# Altium footprint library THU.PcbLib: 477 footprints (part 18 of 30)
Each footprint in its own frame and in the unit in brackets; x right, y up, seen from the top. Pads: shape width x height; smd on the part's side, far side on the other; paste and mask are expansions set on the pad; w line width, h text height; cw(c..) or ccw(c..) is an arc to the next point about the centre after c.
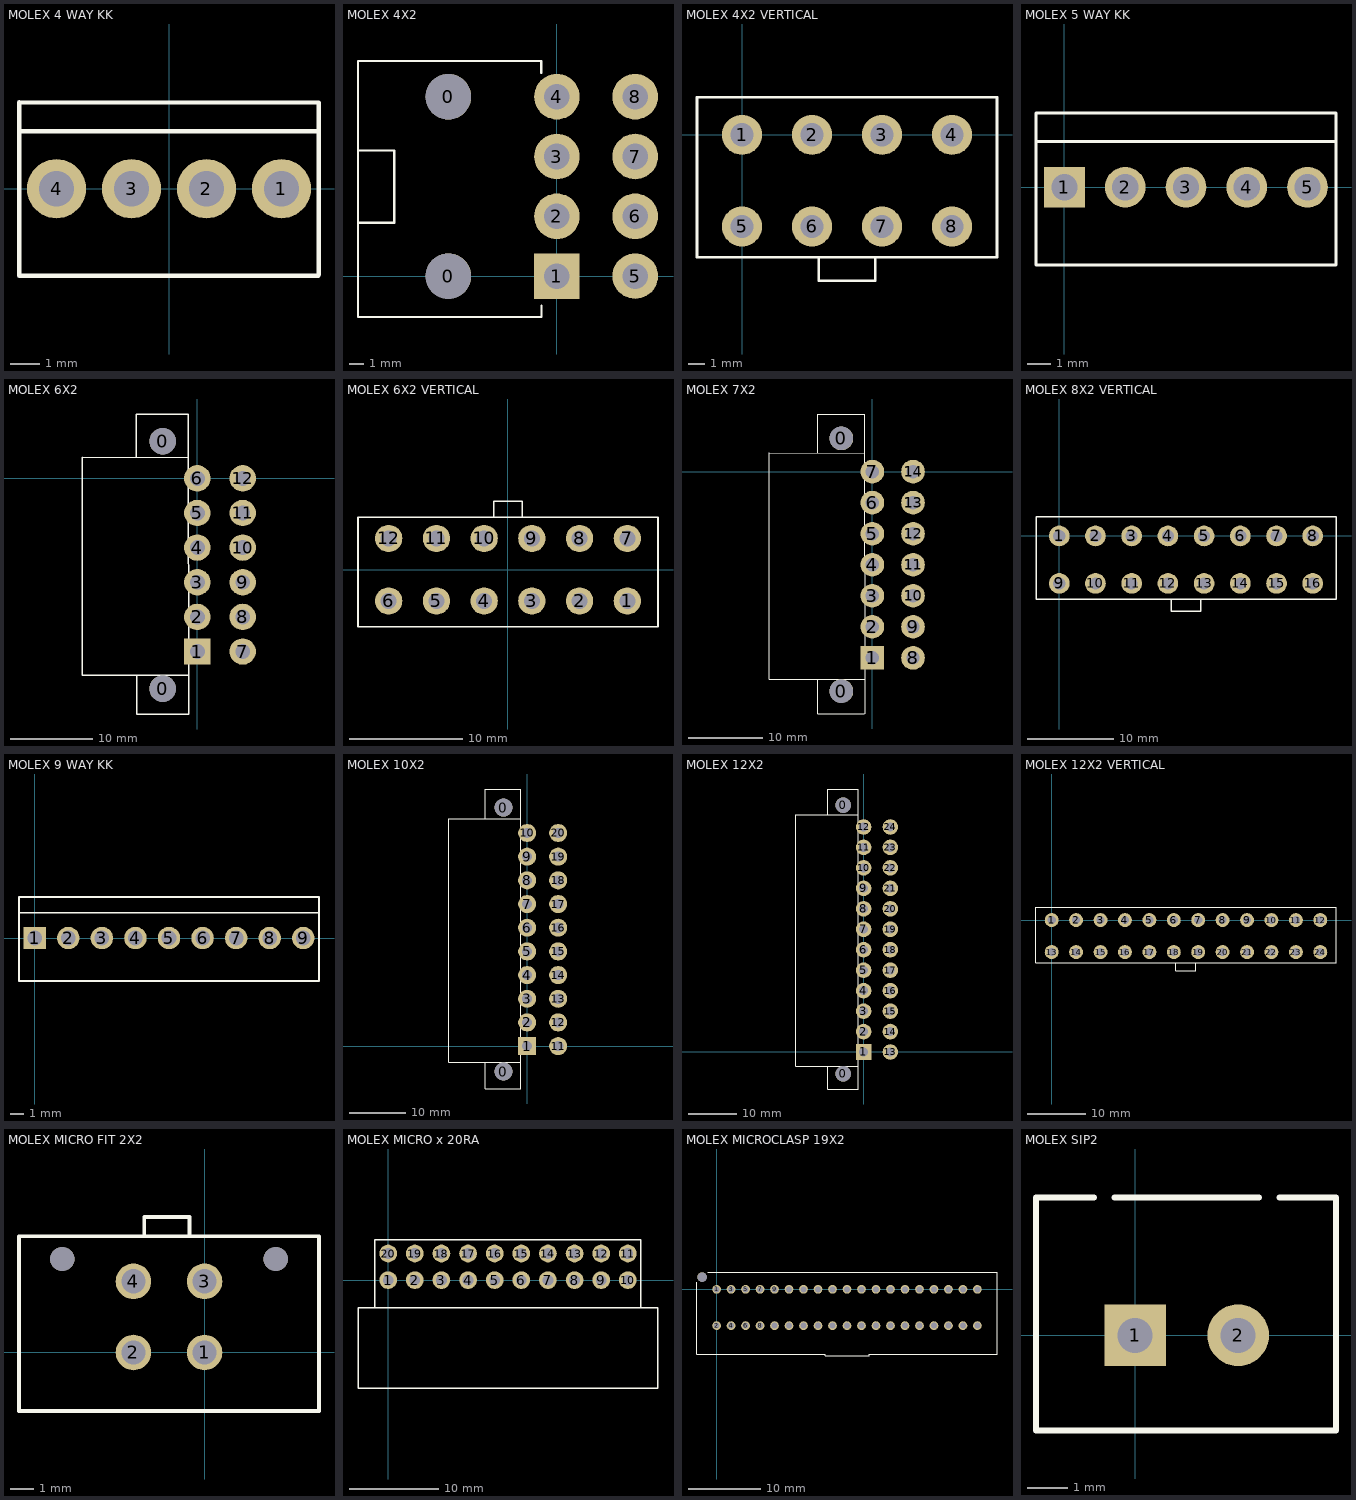
[diagram p17: the footprints below, top view; thin cyan lines are the x and y axes]

## MOLEX 4 WAY KK [mm] "VERTICAL MOUNT"
pads (4):
  round 2 hole 1.19: 1(3.81,0) 2(1.27,0) 3(-1.27,0) 4(-3.81,0)
TopOverlay:
  lines w0.152: -5.08,1.94 5.08,1.94 ; 5.06,-2.94 -5.08,-2.94 -5.08,2.921 5.08,2.92 5.08,-2.92
3D body "022292041.stp": height 11.74, standoff -3.52, extent -5.08,-2.9 5.08,2.9

## MOLEX 4X2 [mm]
pads (10):
  round 3.2 hole 3.2: 0(-7.62,0) 0(-7.62,12.6)
  rect 3.2x3.2 hole 1.8: 1(0,0)
  round 3.2 hole 1.8: 2(0,4.2) 3(0,8.4) 4(0,12.6) 5(5.5,0) 6(5.5,4.2) 7(5.5,8.4) 8(5.5,12.6)
TopOverlay:
  lines w0.152: -13.97,3.743 -11.43,3.743 -11.43,8.823 -13.97,8.823 ; -1.1,14.285 -1.1,15.1 -13.97,15.106 -13.97,-2.87 -1.092,-2.87 -1.092,-2.083

## MOLEX 4X2 VERTICAL [mm] "P/N 39-28-1043"
height 12.8
pads (8):
  round 2.4 hole 1.4: 1(0,0) 2(4.2,0) 3(8.4,0) 4(12.6,0) 5(0,-5.5) 6(4.2,-5.5) 7(8.4,-5.5) 8(12.6,-5.5)
TopOverlay:
  lines w0.152: 4.6,-7.35 4.6,-8.75 6.3,-8.75 8,-8.75 8,-7.35 ; -2.7,-7.35 15.3,-7.35 15.3,2.25 -2.7,2.25 -2.7,-7.35

## MOLEX 5 WAY KK [mm]
pads (5):
  rect 1.7x1.7 hole 1.1: 1(0,0)
  round 1.7 hole 1.1: 2(2.54,0) 3(5.08,0) 4(7.62,0) 5(10.16,0)
TopOverlay:
  lines w0.127: -1.19,1.905 11.35,1.905 ; -1.19,-3.25 11.35,-3.25 11.35,3.1 -1.19,3.1 -1.19,-3.25
3D body: height 8.18, standoff 0, extent -1.19,2.514 11.347,3.074
3D body: height 3.18, standoff 0, extent -1.19,-3.25 11.35,3.1
3D body: height 8.18, standoff 7.18, extent -1.19,1.957 11.35,3.1
3D body: height 10.67, standoff 3.18, extent 2.119,-0.381 2.881,0.381
3D body: height 10.67, standoff 3.18, extent -0.381,-0.381 0.381,0.381
3D body: height 10.67, standoff 3.18, extent 4.659,-0.381 5.421,0.381
3D body: height 10.67, standoff 3.18, extent 7.199,-0.381 7.961,0.381
3D body: height 10.67, standoff 3.18, extent 9.739,-0.381 10.501,0.381

## MOLEX 6X2 [mm]
pads (14):
  round 3.2 hole 3.2: 0(-4.2,-25.5) 0(-4.2,4.5)
  rect 3.2x3.2 hole 1.8: 1(0,-21)
  round 3.2 hole 1.8: 2(0,-16.8) 3(0,-12.6) 4(0,-8.4) 5(0,-4.2) 6(0,0) 7(5.5,-21) 8(5.5,-16.8) 9(5.5,-12.6) 10(5.5,-8.4) 11(5.5,-4.2) 12(5.5,0)
TopOverlay:
  lines w0.152: -7.4,2.5 -7.4,7.8 -1.1,7.8 -1.016,-28.575 -7.366,-28.575 -7.366,-23.876 ; -1.1,-23.9 -13.97,-23.876 -13.97,2.54 -1.1,2.5

## MOLEX 6X2 VERTICAL [mm] "39-28-1063"
pads (12):
  round 2.4 hole 1.4: 1(10.5,-2.75) 2(6.3,-2.75) 3(2.1,-2.75) 4(-2.1,-2.75) 5(-6.3,-2.75) 6(-10.5,-2.75) 7(10.5,2.75) 8(6.3,2.75) 9(2.1,2.75) 10(-2.1,2.75) 11(-6.3,2.75) 12(-10.5,2.75)
TopOverlay:
  lines w0.127: -13.2,-5 13.2,-5 ; -13.2,4.6 13.2,4.6 ; -1.27,4.6 -1.27,6 1.27,6 1.27,4.6
  lines w0.152: -13.2,-5 -13.2,4.6 ; 13.2,-5 13.2,4.6
3D body "039281123.stp": height 12.8, standoff -3.5, extent -13.6,-4.904 13.6,6.096

## MOLEX 7X2 [mm]
pads (16):
  round 3.2 hole 3.2: 0(-4.2,-29.7) 0(-4.2,4.5)
  rect 3.2x3.2 hole 1.8: 1(0,-25.2)
  round 3.2 hole 1.8: 2(0,-21) 3(0,-16.8) 4(0,-12.6) 5(0,-8.4) 6(0,-4.2) 7(0,0) 8(5.5,-25.2) 9(5.5,-21) 10(5.5,-16.8) 11(5.5,-12.6) 12(5.5,-8.4) 13(5.5,-4.2) 14(5.5,0)
TopOverlay:
  lines w0.152: -7.4,-28.1 -7.4,-32.8 -1.1,-32.8 ; -7.4,2.5 -7.4,7.8 -1.1,7.8 -1.016,-32.766 ; -1.1,-28.1 -13.97,-28.067 -13.97,2.54 -1.1,2.5

## MOLEX 8X2 VERTICAL [mm] "P/N 39-28-1163"
height 12.8
pads (16):
  round 2.4 hole 1.4: 1(0,0) 2(4.2,0) 3(8.4,0) 4(12.6,0) 5(16.8,0) 6(21,0) 7(25.2,0) 8(29.4,0) 9(0,-5.5) 10(4.2,-5.5) 11(8.4,-5.5) 12(12.6,-5.5) 13(16.8,-5.5) 14(21,-5.5) 15(25.2,-5.5) 16(29.4,-5.5)
TopOverlay:
  lines w0.152: 13,-7.35 13,-8.75 14.7,-8.75 16.4,-8.75 16.4,-7.35 ; -2.7,-7.35 -2.7,2.25 32.1,2.25 32.1,-7.35 -2.7,-7.35

## MOLEX 9 WAY KK [mm]
pads (9):
  rect 1.7x1.7 hole 1.1: 1(0,0)
  round 1.7 hole 1.1: 2(2.54,0) 3(5.08,0) 4(7.62,0) 5(10.16,0) 6(12.7,0) 7(15.24,0) 8(17.78,0) 9(20.32,0)
TopOverlay:
  lines w0.127: -1.19,1.905 21.51,1.905 ; 21.463,-3.25 -1.19,-3.25 -1.19,3.1 21.19,3.1 21.51,3.1 21.51,-3.25
3D body: height 10.67, standoff 3.18, extent 19.899,-0.381 20.661,0.381
3D body: height 10.67, standoff 3.18, extent 17.359,-0.381 18.121,0.381
3D body: height 10.67, standoff 3.18, extent 14.819,-0.381 15.581,0.381
3D body: height 10.67, standoff 3.18, extent 12.279,-0.381 13.041,0.381
3D body: height 10.67, standoff 3.18, extent 9.739,-0.381 10.501,0.381
3D body: height 10.67, standoff 3.18, extent 7.199,-0.381 7.961,0.381
3D body: height 10.67, standoff 3.18, extent 4.659,-0.381 5.421,0.381
3D body: height 10.67, standoff 3.18, extent -0.381,-0.381 0.381,0.381
3D body: height 10.67, standoff 3.18, extent 2.119,-0.381 2.881,0.381
3D body: height 8.18, standoff 7.18, extent -1.19,1.957 21.51,3.1
3D body: height 3.18, standoff 0, extent -1.19,-3.25 21.51,3.1
3D body: height 8.18, standoff 0, extent -1.19,2.54 21.503,3.1

## MOLEX 10X2 [mm]
pads (22):
  round 3.2 hole 3.2: 0(-4.2,-4.5) 0(-4.2,42.3)
  rect 3.2x3.2 hole 1.8: 1(0,0)
  round 3.2 hole 1.8: 2(0,4.2) 3(0,8.4) 4(0,12.6) 5(0,16.8) 6(0,21) 7(0,25.2) 8(0,29.4) 9(0,33.6) 10(0,37.8) 11(5.5,0) 12(5.5,4.2) 13(5.5,8.4) 14(5.5,12.6) 15(5.5,16.8) 16(5.5,21) 17(5.5,25.2) 18(5.5,29.4) 19(5.5,33.6) 20(5.5,37.8)
TopOverlay:
  lines w0.152: -7.4,-2.9 -7.4,-7.6 -1.1,-7.6 -1.1,45.6 -7.4,45.6 -7.4,40.3 ; -1.1,-2.9 -13.9,-2.9 -13.9,40.3 -1.1,40.3

## MOLEX 12X2 [mm]
pads (26):
  round 3.2 hole 3.2: 0(-4.2,-4.5) 0(-4.2,50.7)
  rect 3.2x3.2 hole 1.8: 1(0,0)
  round 3.2 hole 1.8: 2(0,4.2) 3(0,8.4) 4(0,12.6) 5(0,16.8) 6(0,21) 7(0,25.2) 8(0,29.4) 9(0,33.6) 10(0,37.8) 11(0,42) 12(0,46.2) 13(5.5,0) 14(5.5,4.2) 15(5.5,8.4) 16(5.5,12.6) 17(5.5,16.8) 18(5.5,21) 19(5.5,25.2) 20(5.5,29.4) 21(5.5,33.6) 22(5.5,37.8) 23(5.5,42) 24(5.5,46.2)
TopOverlay:
  lines w0.152: -7.4,-2.9 -7.4,-7.6 -1.1,-7.6 -1.1,54 -7.4,54 -7.4,48.7 ; -1.1,-2.9 -13.9,-2.9 -13.9,48.7 -1.1,48.7

## MOLEX 12X2 VERTICAL [mm]
pads (24):
  round 2.4 hole 1.4: 1(0,0) 2(4.2,0) 3(8.4,0) 4(12.6,0) 5(16.8,0) 6(21,0) 7(25.2,0) 8(29.4,0) 9(33.6,0) 10(37.8,0) 11(42,0) 12(46.2,0) 13(0,-5.5) 14(4.2,-5.5) 15(8.4,-5.5) 16(12.6,-5.5) 17(16.8,-5.5) 18(21,-5.5) 19(25.2,-5.5) 20(29.4,-5.5) 21(33.6,-5.5) 22(37.8,-5.5) 23(42,-5.5) 24(46.2,-5.5)
TopOverlay:
  lines w0.152: 21.368,-7.35 21.368,-8.75 23.068,-8.75 24.768,-8.75 24.768,-7.35 ; -2.7,-7.35 48.9,-7.35 48.9,2.25 -2.7,2.25 -2.7,-7.35

## MOLEX MICRO FIT 2X2 [mm] "Part Number: 43045-0412, 3.00mm Pitch Micro-Fit 3.0™ Header, Surface Mount Compatible, Dual Row, Vertical, with PCB Polarizing Peg, 4 Circuits"
height 9.91
pads (6):
  round 1.5 hole 1.02: 1(0,0) 2(-3,0) 3(0,3) 4(-3,3)
  round 1.02 hole 1.02 unplated: ""(-6,3.94) ""(3,3.94)
TopOverlay:
  lines w0.152: -2.54,4.9 -2.54,5.715 -0.635,5.715 -0.635,4.9 ; -7.825,-2.469 4.825,-2.469 4.825,4.9 -7.825,4.9 -7.825,-2.469

## MOLEX MICRO x 20RA [mm]
pads (20):
  round 2 hole 1.2: 1(0,0) 2(3,0) 3(6,0) 4(9,0) 5(12,0) 6(15,0) 7(18,0) 8(21,0) 9(24,0) 10(27,0) 11(27,3) 12(24,3) 13(21,3) 14(18,3) 15(15,3) 16(12,3) 17(9,3) 18(6,3) 19(3,3) 20(0,3)
TopOverlay:
  lines w0.152: -1.524,-3.1 -1.524,4.572 28.448,4.572 28.448,-3.1 ; -3.4,-12.2 30.4,-12.2 30.4,-3.1 -3.4,-3.1 -3.4,-12.2

## MOLEX MICROCLASP 19X2 [mm] "2.00mm Pitch MicroClasp™ Wire-to-Board Header, Dual Row, Vertical, 38 Circuits, with PCB Locator"
height 9.75
pads (39):
  round 1.2 hole 0.8: 1(0,0) 2(0,-5) 3(2,0) 4(2,-5) 5(4,0) 6(4,-5) 7(6,0) 8(6,-5) 9(8,0) 10(8,-5) 11(10,0) 12(10,-5) 13(12,0) 14(12,-5) 15(14,0) 16(14,-5) 17(16,0) 18(16,-5) 19(18,0) 20(18,-5) 21(20,0) 22(20,-5) 23(22,0) 24(22,-5) 25(24,0) 26(24,-5) 27(26,0) 28(26,-5) 29(28,0) 30(28,-5) 31(30,0) 32(30,-5) 33(32,0) 34(32,-5) 35(34,0) 36(34,-5) 37(36,0) 38(36,-5)
  round 1.3 hole 1.3 unplated: ""(-2,1.7)
TopOverlay:
  lines w0.152: -2.7,1.016 -2.7,-8.95 14.986,-8.95 14.986,-9.144 ; -1.206,2.35 38.7,2.35 38.7,-8.95 21.082,-8.95 21.082,-9.15 14.992,-9.15

## MOLEX SIP2 [mil]
pads (2):
  rect 60x60 hole 34: 1(0,0)
  round 60 hole 34: 2(100,0)
TopOverlay:
  lines w6: -40,133.86 -96.34,133.86 -96.34,-92.52 195,-92.52 195,133.86 140,133.86 ; -20,133.86 120,133.86